# Altium footprint library MainLibrary.PcbLib: 85 footprints (part 6 of 6)
Each footprint in its own frame and in the unit in brackets; x right, y up, seen from the top. Pads: shape width x height; smd on the part's side, far side on the other; paste and mask are expansions set on the pad; w line width, h text height; cw(c..) or ccw(c..) is an arc to the next point about the centre after c.
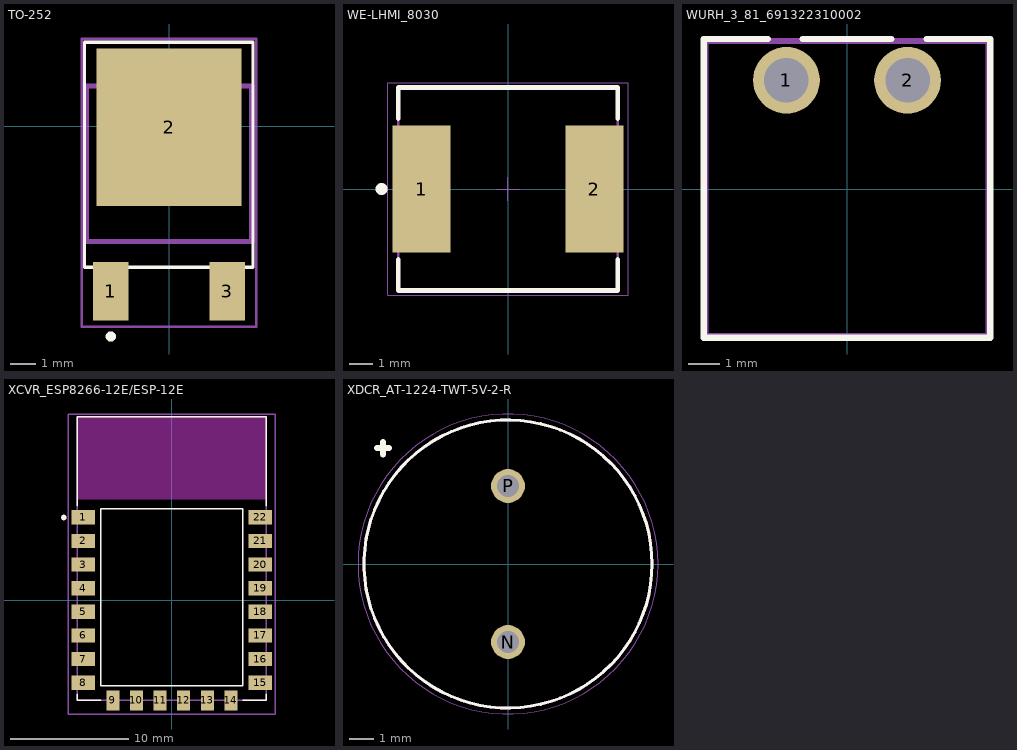
[diagram p5: the footprints below, top view; thin cyan lines are the x and y axes]

## TO-252 [mil]
pads (3):
  rect 55x90 smd: 1(-90,-255) 3(90,-255)
  rect 224.02x243.31 smd: 2(0,-1.65)
Top Overlay:
  lines w5: -130.75,-218 130,-218 130,130 -130.75,130 -130.75,-218
  lines w7.87: -93.94,-325 ccw(c-90,-325) -86.06,-325 ccw(c-90,-325) -93.94,-325
Mechanical 13:
  lines w7.87: -127.95,-177.95 127.95,-177.95 127.95,62.2 -127.95,62.2 -127.95,-177.95
Mechanical 15:
  lines w3.94: -135,-310 135,-310 135,135 -135,135 -135,-310
3D body "IPD50P04P4L-11--3DModel-STEP-56544.STEP": height 98.43, standoff 0, extent -127.95,-285 127.95,107.91

## WE-LHMI_8030 [mm] "SMT Power Inductor, 2-Leads, body 9.2x8.5mm"
height 3
pads (2):
  rect 2.42x5.33 smd: 1(-3.62,0) 2(3.62,0)
Top Overlay:
  circle w0.25: c-5.3,0 r0.125
  lines w0.2: -4.6,-2.95 -4.6,-4.25 4.6,-4.25 4.6,-2.95 ; -4.6,2.95 -4.6,4.25 4.6,4.25 4.6,2.95
Top Courtyard:
  lines w0.05: -5.03,-4.45 -5.03,4.45 5.03,4.45 5.03,-4.45 -5.03,-4.45
Top Component Outline:
  circle w0.1: c-3.6,0 r0.5
  lines w0.1: -4.6,-4.25 -4.6,4.25 4.6,4.25 4.6,-4.25 -4.6,-4.25
Top Component Center:
  lines w0.05: -0.5,0 0.5,0 ; 0,-0.5 0,0.5
3D body "IndLHMI_8030.stp": height 3, standoff 0, extent -4.725,-4.1 4.725,4.1

## WURH_3_81_691322310002 [mm]
pads (2):
  round 2.1 hole 1.4: 1(-1.905,3.429) 2(1.905,3.429)
Top Overlay:
  lines w0.2: -2.5,4.729 -4.505,4.729 -4.505,-4.671 4.505,-4.671 4.505,4.729 2.5,4.729 ; -1.4,4.729 1.4,4.729
Mechanical 13:
  lines w0.1: -4.405,-4.571 -4.405,4.629 4.405,4.629 4.405,-4.571 -4.405,-4.571
Mechanical 15:
  lines w0.127: -4.52,-4.713 4.52,-4.713 4.52,4.699 -4.52,4.699 -4.52,-4.713
3D body "691322310002.stp": height 7.2, standoff -3.5, extent -4.405,-4.473 4.405,4.727

## XCVR_ESP8266-12E/ESP-12E [mm]
pads (22):
  rect 2x1.2 smd: 1(-7.5,7) 2(-7.5,5) 3(-7.5,3) 4(-7.5,1) 5(-7.5,-1) 6(-7.5,-3) 7(-7.5,-5) 8(-7.5,-7) 15(7.5,-7) 16(7.5,-5) 17(7.5,-3) 18(7.5,-1) 19(7.5,1) 20(7.5,3) 21(7.5,5) 22(7.5,7)
  rect 1.1x1.7 smd: 9(-5,-8.5) 10(-3,-8.5) 11(-1,-8.5) 12(1,-8.5) 13(3,-8.5) 14(5,-8.5)
Top Overlay:
  circle w0.27: c-9.144,6.985 r0.1
  lines w0.127: -8,-8 -8,-8.5 -6,-8.5 ; -8,8 -8,15.5 8,15.5 8,8 ; 6,-8.5 8,-8.5 8,-8 ; -6,-7.26 -6,7.74 6,7.74 6,-7.26 -6,-7.26
Keep-Out Layer:
  region: 8,8.51 -8.009,8.51 -8.009,15.5 8,15.5
  region: 8,8.51 -8.009,8.51 -8.009,15.5 8,15.5
Mechanical 13:
  lines w0.127: -8,-8.5 -8,15.5 8,15.5 8,-8.5 -8,-8.5
Mechanical 15:
  lines w0.127: -8.763,-9.652 8.763,-9.652 8.763,15.748 -8.763,15.748 -8.763,-9.652
3D body "step_temp.STEP": height 3, standoff 0, extent -8,-8.509 8,15.491

## XDCR_AT-1224-TWT-5V-2-R [mm]
height 9.8
pads (2):
  round 1.408 hole 0.9: N(0,-3.25) P(0,3.25)
Top Overlay:
  circle w0.127: c0,0 r6
  lines w0.254: -5.461,4.826 -4.953,4.826 ; -5.207,4.572 -5.207,5.08
Mechanical 13:
  circle w0.127: c0,0 r6
Mechanical 15:
  circle w0.05: c0,0 r6.25
3D body "AT-1224-TWT-5V-2-R--3DModel-STEP-461651.STEP": height 9.08, standoff -3.77, extent -5.997,-6.006 5.997,8.732